# Altium footprint library ESKDPcbLib.PcbLib: 608 footprints (part 26 of 38)
Each footprint in its own frame and in the unit in brackets; x right, y up, seen from the top. Pads: shape width x height; smd on the part's side, far side on the other; paste and mask are expansions set on the pad; w line width, h text height; cw(c..) or ccw(c..) is an arc to the next point about the centre after c.
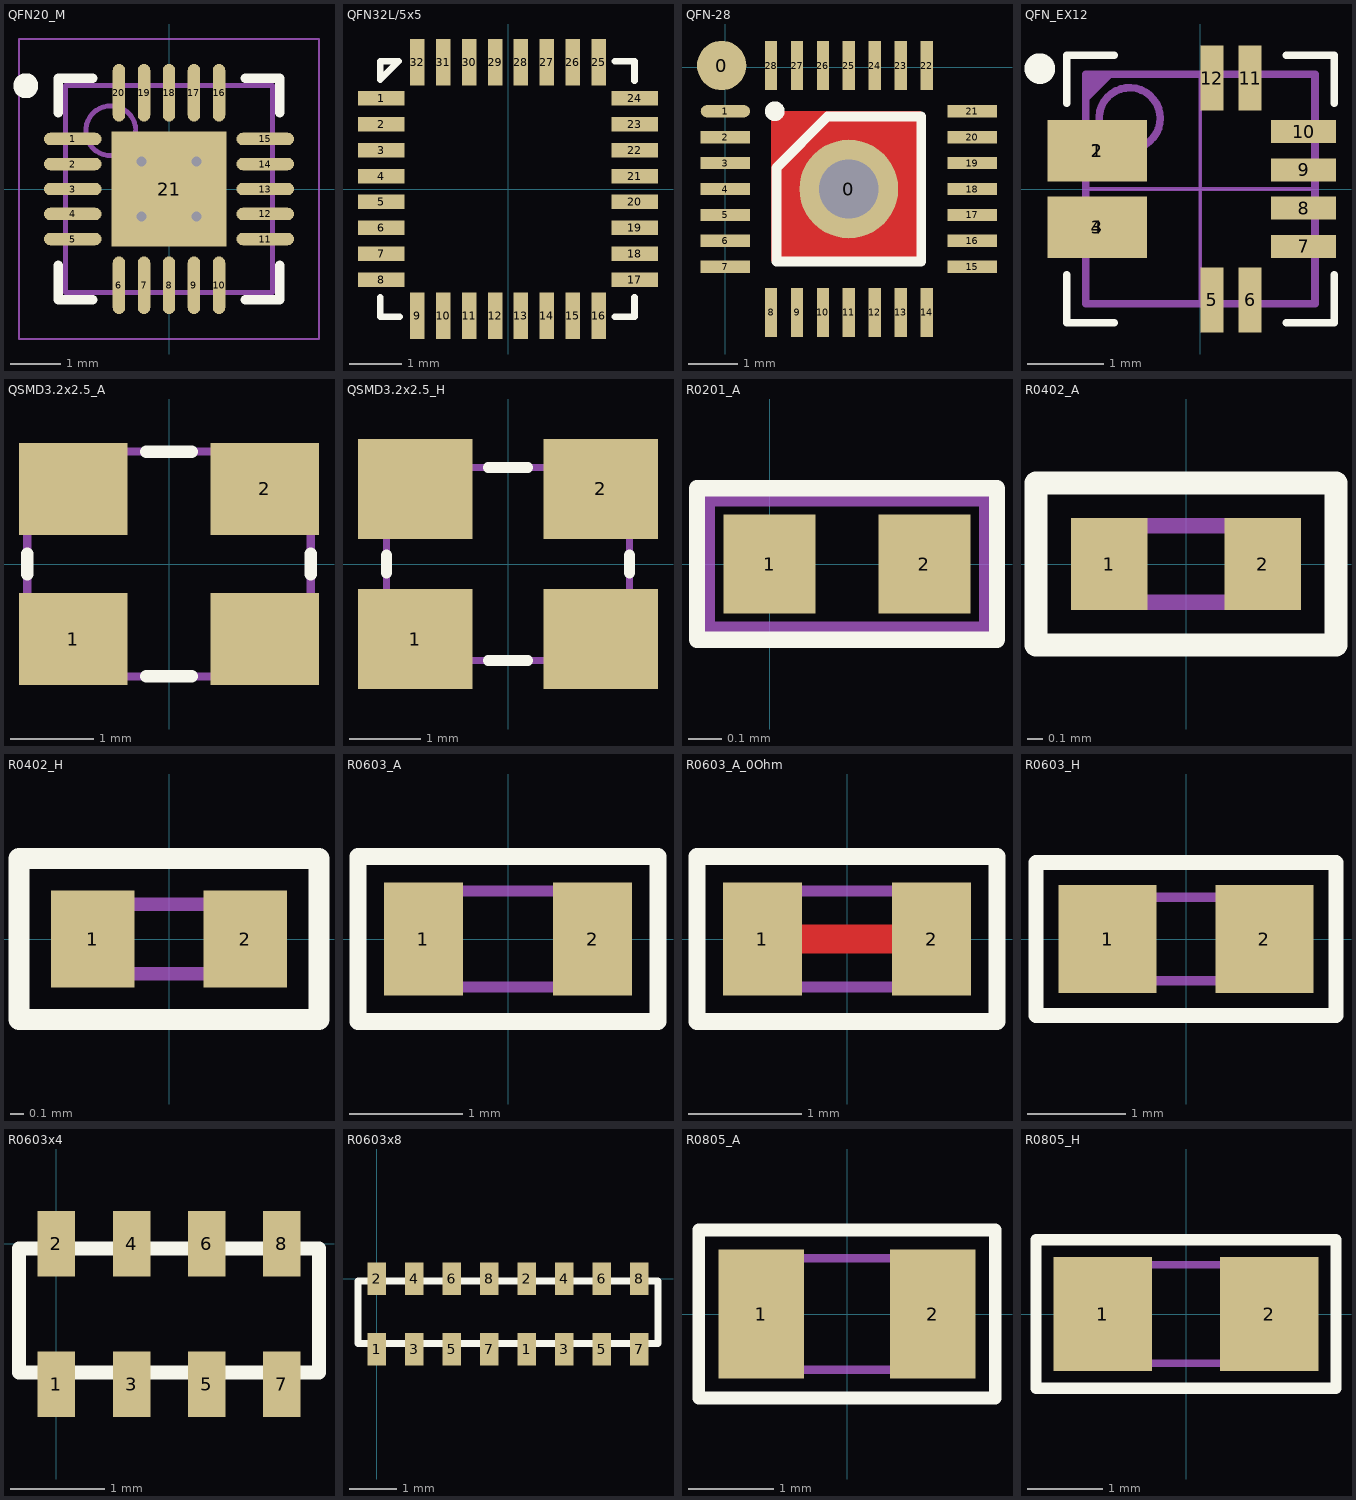
[diagram p25: the footprints below, top view; thin cyan lines are the x and y axes]

## QFN20_M [mm] "QFN, 20-Leads, Body 4x4mm, Pitch 0.5mm, Thermal Pad 2.3x2.3mm, IPC Low Density"
height 1
pads (21):
  oval 1.15x0.25 smd: 1(-1.925,1) 2(-1.925,0.5) 3(-1.925,0) 4(-1.925,-0.5) 5(-1.925,-1) 11(1.925,-1) 12(1.925,-0.5) 13(1.925,0) 14(1.925,0.5) 15(1.925,1)
  oval 0.25x1.15 smd: 6(-1,-1.925) 7(-0.5,-1.925) 8(0,-1.925) 9(0.5,-1.925) 10(1,-1.925) 16(1,1.925) 17(0.5,1.925) 18(0,1.925) 19(-0.5,1.925) 20(-1,1.925)
  rect 2.3x2.3 smd: 21(0,0)
via -0.55,0.55 diameter 0.5 hole 0.2
via 0.55,0.55 diameter 0.5 hole 0.2
via -0.55,-0.55 diameter 0.5 hole 0.2
via 0.55,-0.55 diameter 0.5 hole 0.2
Top Overlay:
  circle w0.25: c-2.865,2.065 r0.125
  lines w0.2: -2.215,-1.525 -2.215,-2.215 -1.525,-2.215 ; -2.215,1.525 -2.215,2.215 -1.525,2.215 ; 1.525,-2.215 2.215,-2.215 2.215,-1.525 ; 1.525,2.215 2.215,2.215 2.215,1.525
Mechanical 13:
  circle w0.1: c-1.165,1.165 r0.5
  lines w0.1: -2.065,-2.065 -2.065,2.065 2.065,2.065 2.065,-2.065 -2.065,-2.065
Mechanical 15:
  lines w0.05: -3,-3 -3,3 3,3 3,-3 -3,-3
  lines w0.1: -0.5,0 0.5,0 ; 0,-0.5 0,0.5
3D body: height 1, standoff 0, extent -2.065,-2.065 2.065,2.065

## QFN32L/5x5 [mm]
pads (32):
  rect 0.9x0.28 smd: 1(-2.441,1.75) 2(-2.441,1.25) 3(-2.441,0.75) 4(-2.441,0.25) 5(-2.441,-0.25) 6(-2.441,-0.75) 7(-2.441,-1.25) 8(-2.441,-1.75) 17(2.441,-1.75) 18(2.441,-1.25) 19(2.441,-0.75) 20(2.441,-0.25) 21(2.441,0.25) 22(2.441,0.75) 23(2.441,1.25) 24(2.441,1.75)
  rect 0.28x0.9 smd: 9(-1.75,-2.441) 10(-1.25,-2.441) 11(-0.75,-2.441) 12(-0.25,-2.441) 13(0.25,-2.441) 14(0.75,-2.441) 15(1.25,-2.441) 16(1.75,-2.441) 25(1.75,2.441) 26(1.25,2.441) 27(0.75,2.441) 28(0.25,2.441) 29(-0.25,2.441) 30(-0.75,2.441) 31(-1.25,2.441) 32(-1.75,2.441)
Top Overlay:
  lines w0.127: -2.464,-2.083 -2.464,-2.464 -2.083,-2.464 ; 2.057,-2.464 2.438,-2.464 2.438,-2.083 ; 2.057,2.464 2.438,2.464 2.438,2.083 ; -2.464,2.111 -2.464,2.464 -2.111,2.464 -2.464,2.111

## QFN-28 [mm]
pads (30):
  round 1 smd: 0(-0.075,0.036)
  round 2 hole 1.2 mask+0: 0(2.5,-2.464)
  oval 1x0.25 smd: 1(0,-0.889)
  rect 1x0.25 smd: 2(0,-1.414) 3(0,-1.939) 4(0,-2.464) 5(0,-2.989) 6(0,-3.514) 7(0,-4.039) 15(5,-4.039) 16(5,-3.514) 17(5,-2.989) 18(5,-2.464) 19(5,-1.939) 20(5,-1.414) 21(5,-0.889)
  rect 0.25x1 smd: 8(0.925,-4.964) 9(1.45,-4.964) 10(1.975,-4.964) 11(2.5,-4.964) 12(3.025,-4.964) 13(3.55,-4.964) 14(4.075,-4.964) 22(4.075,0.036) 23(3.55,0.036) 24(3.025,0.036) 25(2.5,0.036) 26(1.975,0.036) 27(1.45,0.036) 28(0.925,0.036)
Top Layer:
  rectangle: 0.925,-3.929 3.965,-0.889
Top Overlay:
  circle w0.2: c1,-0.889 r0.1
  lines w0.2: 1.035,-3.929 1.035,-2.034 2.07,-0.999 3.965,-0.999 3.965,-3.929 1.035,-3.929

## QFN_EX12 [mm] "QFN, 12-Leads, Body 3x3mm, Pitch 0.5mm"
height 0.4
pads (12):
  rect 1.3x0.8 smd mask+0.075: 1(-1.35,0.5) 2(-1.35,0.5) 3(-1.35,-0.5) 4(-1.35,-0.5)
  rect 0.3x0.85 smd mask+0.075: 5(0.15,-1.45) 6(0.65,-1.45) 11(0.65,1.45) 12(0.15,1.45)
  rect 0.85x0.3 smd mask+0.075: 7(1.35,-0.75) 8(1.35,-0.25) 9(1.35,0.25) 10(1.35,0.75)
Top Overlay:
  circle w0.3: c-2.1,1.575 r0.05
  lines w0.1: -1.75,-1.125 -1.75,-1.75 -1.125,-1.75 ; -1.75,1.125 -1.75,1.75 -1.125,1.75 ; 1.125,-1.75 1.75,-1.75 1.75,-1.125 ; 1.125,1.75 1.75,1.75 1.75,1.125
Mechanical 7:
  lines w0.05: -1.488,1.162 -1.161,1.489 ; -1.475,0 1.475,0 ; 0,-1.475 0,1.45 ; -1.5,-1.5 1.5,-1.5 1.5,1.5 -1.5,1.5 -1.5,-1.5
  lines w0.1: -1.47,1.403 -1.4,1.473 ; -1.463,1.258 -1.25,1.472 ; -1.451,1.319 -1.297,1.472
Mechanical 9:
  circle w0.1: c-0.925,0.925 r0.4
  lines w0.1: -1.5,-1.5 -1.5,1.5 1.5,1.5 1.5,-1.5 -1.5,-1.5
Mechanical 10:
  text ".Designator" at -1,-2.4 h0.6
  text ".Comment" at -0.925,2.125 h0.6
3D body: height 0.75, standoff 0.05, extent -1.5,-1.5 1.5,1.5

## QSMD3.2x2.5_A [mm]
height 1.2
pads (4):
  rect 1.3x1.1 smd: 1(-1.15,-0.9) 2(1.15,0.9) ""(-1.15,0.9) ""(1.15,-0.9)
Top Overlay:
  lines w0.15: -1.7,-0.125 -1.7,0.125 ; -0.275,-1.35 0.275,-1.35 ; -0.275,1.35 0.275,1.35 ; 1.7,-0.125 1.7,0.125
Mechanical 7:
  lines w0.1: -1.7,-1.35 1.7,-1.35 1.7,1.35 -1.7,1.35 -1.7,-1.35
Mechanical 10:
  text ".Comment" at -0.825,1.85 h0.6
  text ".Designator" at -0.85,2.425 h0.8
3D body: height 1.2, standoff 0, extent -1.7,-1.35 1.7,1.35

## QSMD3.2x2.5_H [mm]
height 1.2
pads (4):
  rect 1.6x1.4 smd: 1(-1.3,-1.05) 2(1.3,1.05) ""(-1.3,1.05) ""(1.3,-1.05)
Top Overlay:
  lines w0.15: -1.7,-0.125 -1.7,0.125 ; -0.275,-1.35 0.275,-1.35 ; -0.275,1.35 0.275,1.35 ; 1.7,-0.125 1.7,0.125
Mechanical 7:
  lines w0.1: -1.7,-1.35 -1.7,1.35 1.7,1.35 1.7,-1.35 -1.7,-1.35
Mechanical 10:
  text ".Designator" at -0.825,2.75 h0.8
  text ".Comment" at -0.8,2.175 h0.6
3D body: height 1.2, standoff 0, extent -1.7,-1.35 1.7,1.35

## R0201_A [mm]
pads (2):
  rect 0.28x0.3 smd mask+0.05: 1(0,0) 2(0.47,0)
Top Overlay:
  lines w0.05: -0.22,-0.23 -0.22,0.23 0.69,0.23 0.69,-0.23 -0.22,-0.23
Mechanical 7:
  lines w0.05: -0.19,-0.2 0.66,-0.2 0.66,0.2 -0.19,0.2 -0.19,-0.2
Mechanical 10:
  text ".Comment" at -0.08,-1.13 h0.6
  text ".Designator" at -0.08,0.73 h0.8
3D body: height 0.23, standoff 0, extent -0.06,-0.15 0.53,0.15

## R0402_A [mm]
height 0.35
pads (2):
  rect 0.5x0.6 smd: 1(-0.5,0) 2(0.5,0)
Top Overlay:
  lines w0.15: -0.98,-0.53 -0.98,0.53 0.98,0.53 0.98,-0.53 -0.98,-0.53
Mechanical 7:
  lines w0.1: -0.5,-0.25 0.5,-0.25 0.5,0.25 -0.5,0.25 -0.5,-0.25
Mechanical 10:
  text ".Designator" at -0.58,0.75 h0.8
  text ".Comment" at -0.58,-1.11 h0.6
3D body "RES0402.step": height 0.34, standoff 0, extent -0.52,-0.3 0.52,0.3

## R0402_H [mm]
height 0.35
pads (2):
  rect 0.6x0.7 smd: 1(-0.55,0) 2(0.55,0)
Top Overlay:
  lines w0.15: -1.08,-0.58 1.08,-0.58 1.08,0.58 -1.08,0.58 -1.08,-0.58
Mechanical 7:
  lines w0.1: -0.5,-0.25 -0.5,0.25 0.5,0.25 0.5,-0.25 -0.5,-0.25
Mechanical 10:
  text ".Comment" at -0.65,-1.15 h0.6
  text ".Designator" at -0.58,0.75 h0.8
3D body: height 0.35, standoff 0, extent -0.5,-0.25 0.5,0.25

## R0603_A [mm]
height 0.45
pads (2):
  rect 0.7x1 smd: 1(-0.75,0) 2(0.75,0)
Top Overlay:
  lines w0.15: -1.33,-0.73 -1.33,0.73 1.33,0.73 1.33,-0.73 -1.33,-0.73
Mechanical 7:
  lines w0.1: -0.8,-0.425 0.8,-0.425 0.8,0.425 -0.8,0.425 -0.8,-0.425
Mechanical 10:
  text ".Comment" at -0.69,-1.29 h0.6
  text ".Designator" at -0.62,1 h0.8
3D body "RES0603.STEP": height 0.5, standoff 0, extent -0.8,-0.4 0.8,0.4

## R0603_A_0Ohm [mm]
height 0.45
pads (2):
  rect 0.7x1 smd: 1(-0.75,0) 2(0.75,0)
Top Layer:
  lines w0.254: -0.75,0 0.75,0
Top Overlay:
  lines w0.15: -1.33,-0.73 -1.33,0.73 1.33,0.73 1.33,-0.73 -1.33,-0.73
Mechanical 7:
  lines w0.1: -0.8,-0.425 0.8,-0.425 0.8,0.425 -0.8,0.425 -0.8,-0.425
Mechanical 10:
  text ".Comment" at -0.69,-1.29 h0.6
  text ".Designator" at -0.62,1 h0.8
3D body "RES0603.STEP": height 0.5, standoff 0, extent -0.8,-0.4 0.8,0.4

## R0603_H [mm]
height 0.45
pads (2):
  rect 1x1.1 smd: 1(-0.8,0) 2(0.8,0)
Top Overlay:
  lines w0.15: -1.53,-0.78 -1.53,0.78 1.53,0.78 1.53,-0.78 -1.53,-0.78
Mechanical 7:
  lines w0.1: -0.8,-0.425 0.8,-0.425 0.8,0.425 -0.8,0.425 -0.8,-0.425
Mechanical 10:
  text ".Designator" at -0.62,1 h0.8
  text ".Comment" at -0.78,-1.36 h0.6
3D body: height 0.45, standoff 0, extent -0.8,-0.425 0.8,0.425

## R0603x4 [mm]
height 0.55
pads (8):
  rect 0.4x0.7 smd: 1(0,-1.5) 2(0,0) 3(0.8,-1.5) 4(0.8,0) 5(1.6,-1.5) 6(1.6,0) 7(2.4,-1.5) 8(2.4,0)
Top Overlay:
  lines w0.15: -0.4,-1.375 -0.4,-0.05 2.8,-0.05 2.8,-1.375 -0.4,-1.375
Mechanical 7:
  lines w0.1: -0.4,-1.375 2.8,-1.375 2.8,-0.05 -0.4,-0.05 -0.4,-1.375
Mechanical 10:
  text ".Designator" at -0.58,0.75 h0.8
  text ".Comment" at -0.56,-1.1 h0.6
3D body: height 0.55, standoff 0, extent -0.4,-1.375 2.825,-0.05

## R0603x8 [mm]
height 0.55
pads (16):
  rect 0.4x0.7 smd: 1(0,-1.5) 1(3.2,-1.5) 2(0,0) 2(3.2,0) 3(0.8,-1.5) 3(4,-1.5) 4(0.8,0) 4(4,0) 5(1.6,-1.5) 5(4.8,-1.5) 6(1.6,0) 6(4.8,0) 7(2.4,-1.5) 7(5.6,-1.5) 8(2.4,0) 8(5.6,0)
Top Overlay:
  lines w0.15: -0.4,-1.375 -0.4,-0.05 6,-0.05 6,-1.375 -0.4,-1.375
Mechanical 7:
  lines w0.1: -0.4,-1.375 6,-1.375 6,-0.05 -0.4,-0.05 -0.4,-1.375
Mechanical 10:
  text ".Designator" at -0.58,0.75 h0.8
  text ".Comment" at -0.56,-1.1 h0.6
3D body: height 0.55, standoff 0, extent -0.4,-1.375 6,-0.05

## R0805_A [mm]
height 0.5
pads (2):
  rect 1x1.5 smd: 1(-1,0) 2(1,0)
Top Overlay:
  lines w0.15: -1.73,-0.98 -1.73,0.98 1.73,0.98 1.73,-0.98 -1.73,-0.98
Mechanical 7:
  lines w0.1: -1.05,-0.65 1.05,-0.65 1.05,0.65 -1.05,0.65 -1.05,-0.65
Mechanical 10:
  text ".Comment" at -0.56,-1.62 h0.6
  text ".Designator" at -0.47,1.37 h0.8
3D body "RES0805.step": height 0.5, standoff 0, extent -1,-0.625 1,0.625

## R0805_H [mm]
height 0.5
pads (2):
  rect 1.3x1.5 smd: 1(-1.1,0) 2(1.1,0)
Top Overlay:
  lines w0.15: -1.98,-0.98 -1.98,0.98 1.98,0.98 1.98,-0.98 -1.98,-0.98
Mechanical 7:
  lines w0.1: -1.05,-0.65 -1.05,0.65 1.05,0.65 1.05,-0.65 -1.05,-0.65
Mechanical 10:
  text ".Designator" at -0.47,1.37 h0.8
  text ".Comment" at -0.64,-1.56 h0.6
3D body: height 0.5, standoff 0, extent -1.05,-0.65 1.05,0.65